# Altium footprint library IC_SMD_BGA.PCBLIB: 101 footprints (part 12 of 13) (continued)
## BGA100_2892_S55 [mm] "BGA, 2892-Leads, Body 55x55mmx4.30mm, Pitch 1.00mm" (continued)
BB35(7.5,-14.5) BB36(8.5,-14.5) BB37(9.5,-14.5) BB38(10.5,-14.5) BB39(11.5,-14.5) BB40(12.5,-14.5) BB41(13.5,-14.5) BB42(14.5,-14.5) BB43(15.5,-14.5) BB44(16.5,-14.5) BB45(17.5,-14.5) BB46(18.5,-14.5) BB47(19.5,-14.5) BB48(20.5,-14.5) BB49(21.5,-14.5) BB50(22.5,-14.5) BB51(23.5,-14.5) BB52(24.5,-14.5) BB53(25.5,-14.5) BB54(26.5,-14.5) BC1(-26.5,-15.5) BC2(-25.5,-15.5) BC3(-24.5,-15.5) BC4(-23.5,-15.5) BC5(-22.5,-15.5) BC6(-21.5,-15.5) BC7(-20.5,-15.5) BC8(-19.5,-15.5) BC9(-18.5,-15.5) BC10(-17.5,-15.5) BC11(-16.5,-15.5) BC12(-15.5,-15.5) BC13(-14.5,-15.5) BC14(-13.5,-15.5) BC15(-12.5,-15.5) BC16(-11.5,-15.5) BC17(-10.5,-15.5) BC18(-9.5,-15.5) BC19(-8.5,-15.5) BC20(-7.5,-15.5) BC21(-6.5,-15.5) BC22(-5.5,-15.5) BC23(-4.5,-15.5) BC24(-3.5,-15.5) BC25(-2.5,-15.5) BC26(-1.5,-15.5) BC27(-0.5,-15.5) BC28(0.5,-15.5) BC29(1.5,-15.5) BC30(2.5,-15.5) BC31(3.5,-15.5) BC32(4.5,-15.5) BC33(5.5,-15.5) BC34(6.5,-15.5) BC35(7.5,-15.5) BC36(8.5,-15.5) BC37(9.5,-15.5) BC38(10.5,-15.5) BC39(11.5,-15.5) BC40(12.5,-15.5) BC41(13.5,-15.5) BC42(14.5,-15.5) BC43(15.5,-15.5) BC44(16.5,-15.5) BC45(17.5,-15.5) BC46(18.5,-15.5) BC47(19.5,-15.5) BC48(20.5,-15.5) BC49(21.5,-15.5) BC50(22.5,-15.5) BC51(23.5,-15.5) BC52(24.5,-15.5) BC53(25.5,-15.5) BC54(26.5,-15.5) BD1(-26.5,-16.5) BD2(-25.5,-16.5) BD3(-24.5,-16.5) BD4(-23.5,-16.5) BD5(-22.5,-16.5) BD6(-21.5,-16.5) BD7(-20.5,-16.5) BD8(-19.5,-16.5) BD9(-18.5,-16.5) BD10(-17.5,-16.5) BD11(-16.5,-16.5) BD12(-15.5,-16.5) BD13(-14.5,-16.5) BD14(-13.5,-16.5) BD15(-12.5,-16.5) BD16(-11.5,-16.5) BD17(-10.5,-16.5) BD18(-9.5,-16.5) BD19(-8.5,-16.5) BD20(-7.5,-16.5) BD21(-6.5,-16.5) BD22(-5.5,-16.5) BD23(-4.5,-16.5) BD24(-3.5,-16.5) BD25(-2.5,-16.5) BD26(-1.5,-16.5) BD27(-0.5,-16.5) BD28(0.5,-16.5) BD29(1.5,-16.5) BD30(2.5,-16.5) BD31(3.5,-16.5) BD32(4.5,-16.5) BD33(5.5,-16.5) BD34(6.5,-16.5) BD35(7.5,-16.5) BD36(8.5,-16.5) BD37(9.5,-16.5) BD38(10.5,-16.5) BD39(11.5,-16.5) BD40(12.5,-16.5) BD41(13.5,-16.5) BD42(14.5,-16.5) BD43(15.5,-16.5) BD44(16.5,-16.5) BD45(17.5,-16.5) BD46(18.5,-16.5) BD47(19.5,-16.5) BD48(20.5,-16.5) BD49(21.5,-16.5) BD50(22.5,-16.5) BD51(23.5,-16.5) BD52(24.5,-16.5) BD53(25.5,-16.5) BD54(26.5,-16.5) BE1(-26.5,-17.5) BE2(-25.5,-17.5) BE3(-24.5,-17.5) BE4(-23.5,-17.5) BE5(-22.5,-17.5) BE6(-21.5,-17.5) BE7(-20.5,-17.5) BE8(-19.5,-17.5) BE9(-18.5,-17.5) BE10(-17.5,-17.5) BE11(-16.5,-17.5) BE12(-15.5,-17.5) BE13(-14.5,-17.5) BE14(-13.5,-17.5) BE15(-12.5,-17.5) BE16(-11.5,-17.5) BE17(-10.5,-17.5) BE18(-9.5,-17.5) BE19(-8.5,-17.5) BE20(-7.5,-17.5) BE21(-6.5,-17.5) BE22(-5.5,-17.5) BE23(-4.5,-17.5) BE24(-3.5,-17.5) BE25(-2.5,-17.5) BE26(-1.5,-17.5) BE27(-0.5,-17.5) BE28(0.5,-17.5) BE29(1.5,-17.5) BE30(2.5,-17.5) BE31(3.5,-17.5) BE32(4.5,-17.5) BE33(5.5,-17.5) BE34(6.5,-17.5) BE35(7.5,-17.5) BE36(8.5,-17.5) BE37(9.5,-17.5) BE38(10.5,-17.5) BE39(11.5,-17.5) BE40(12.5,-17.5) BE41(13.5,-17.5) BE42(14.5,-17.5) BE43(15.5,-17.5) BE44(16.5,-17.5) BE45(17.5,-17.5) BE46(18.5,-17.5) BE47(19.5,-17.5) BE48(20.5,-17.5) BE49(21.5,-17.5) BE50(22.5,-17.5) BE51(23.5,-17.5) BE52(24.5,-17.5) BE53(25.5,-17.5) BE54(26.5,-17.5) BF1(-26.5,-18.5) BF2(-25.5,-18.5) BF3(-24.5,-18.5) BF4(-23.5,-18.5) BF5(-22.5,-18.5) BF6(-21.5,-18.5) BF7(-20.5,-18.5) BF8(-19.5,-18.5) BF9(-18.5,-18.5) BF10(-17.5,-18.5) BF11(-16.5,-18.5) BF12(-15.5,-18.5) BF13(-14.5,-18.5) BF14(-13.5,-18.5) BF15(-12.5,-18.5) BF16(-11.5,-18.5) BF17(-10.5,-18.5) BF18(-9.5,-18.5) BF19(-8.5,-18.5) BF20(-7.5,-18.5) BF21(-6.5,-18.5) BF22(-5.5,-18.5) BF23(-4.5,-18.5) BF24(-3.5,-18.5) BF25(-2.5,-18.5) BF26(-1.5,-18.5) BF27(-0.5,-18.5) BF28(0.5,-18.5) BF29(1.5,-18.5) BF30(2.5,-18.5) BF31(3.5,-18.5) BF32(4.5,-18.5) BF33(5.5,-18.5) BF34(6.5,-18.5) BF35(7.5,-18.5) BF36(8.5,-18.5) BF37(9.5,-18.5) BF38(10.5,-18.5) BF39(11.5,-18.5) BF40(12.5,-18.5) BF41(13.5,-18.5) BF42(14.5,-18.5) BF43(15.5,-18.5) BF44(16.5,-18.5) BF45(17.5,-18.5) BF46(18.5,-18.5) BF47(19.5,-18.5) BF48(20.5,-18.5) BF49(21.5,-18.5) BF50(22.5,-18.5) BF51(23.5,-18.5) BF52(24.5,-18.5) BF53(25.5,-18.5) BF54(26.5,-18.5) BG1(-26.5,-19.5) BG2(-25.5,-19.5) BG3(-24.5,-19.5) BG4(-23.5,-19.5) BG5(-22.5,-19.5) BG6(-21.5,-19.5) BG7(-20.5,-19.5) BG8(-19.5,-19.5) BG9(-18.5,-19.5) BG10(-17.5,-19.5) BG11(-16.5,-19.5) BG12(-15.5,-19.5) BG13(-14.5,-19.5) BG14(-13.5,-19.5) BG15(-12.5,-19.5) BG16(-11.5,-19.5) BG17(-10.5,-19.5) BG18(-9.5,-19.5) BG19(-8.5,-19.5) BG20(-7.5,-19.5) BG21(-6.5,-19.5) BG22(-5.5,-19.5) BG23(-4.5,-19.5) BG24(-3.5,-19.5) BG25(-2.5,-19.5) BG26(-1.5,-19.5) BG27(-0.5,-19.5) BG28(0.5,-19.5) BG29(1.5,-19.5) BG30(2.5,-19.5) BG31(3.5,-19.5) BG32(4.5,-19.5) BG33(5.5,-19.5) BG34(6.5,-19.5) BG35(7.5,-19.5) BG36(8.5,-19.5) BG37(9.5,-19.5) BG38(10.5,-19.5) BG39(11.5,-19.5) BG40(12.5,-19.5) BG41(13.5,-19.5) BG42(14.5,-19.5) BG43(15.5,-19.5) BG44(16.5,-19.5) BG45(17.5,-19.5) BG46(18.5,-19.5) BG47(19.5,-19.5) BG48(20.5,-19.5) BG49(21.5,-19.5) BG50(22.5,-19.5) BG51(23.5,-19.5) BG52(24.5,-19.5) BG53(25.5,-19.5) BG54(26.5,-19.5) BH1(-26.5,-20.5) BH2(-25.5,-20.5) BH3(-24.5,-20.5) BH4(-23.5,-20.5) BH5(-22.5,-20.5) BH6(-21.5,-20.5) BH7(-20.5,-20.5) BH8(-19.5,-20.5) BH9(-18.5,-20.5) BH10(-17.5,-20.5) BH11(-16.5,-20.5) BH12(-15.5,-20.5) BH13(-14.5,-20.5) BH14(-13.5,-20.5) BH15(-12.5,-20.5) BH16(-11.5,-20.5) BH17(-10.5,-20.5) BH18(-9.5,-20.5) BH19(-8.5,-20.5) BH20(-7.5,-20.5) BH21(-6.5,-20.5) BH22(-5.5,-20.5) BH23(-4.5,-20.5) BH24(-3.5,-20.5) BH25(-2.5,-20.5) BH26(-1.5,-20.5) BH27(-0.5,-20.5) BH28(0.5,-20.5) BH29(1.5,-20.5) BH30(2.5,-20.5) BH31(3.5,-20.5) BH32(4.5,-20.5) BH33(5.5,-20.5) BH34(6.5,-20.5) BH35(7.5,-20.5) BH36(8.5,-20.5) BH37(9.5,-20.5) BH38(10.5,-20.5) BH39(11.5,-20.5) BH40(12.5,-20.5) BH41(13.5,-20.5) BH42(14.5,-20.5) BH43(15.5,-20.5) BH44(16.5,-20.5) BH45(17.5,-20.5) BH46(18.5,-20.5) BH47(19.5,-20.5) BH48(20.5,-20.5) BH49(21.5,-20.5) BH50(22.5,-20.5) BH51(23.5,-20.5) BH52(24.5,-20.5) BH53(25.5,-20.5) BH54(26.5,-20.5) BJ1(-26.5,-21.5) BJ2(-25.5,-21.5) BJ3(-24.5,-21.5) BJ4(-23.5,-21.5) BJ5(-22.5,-21.5) BJ6(-21.5,-21.5) BJ7(-20.5,-21.5) BJ8(-19.5,-21.5) BJ9(-18.5,-21.5) BJ10(-17.5,-21.5) BJ11(-16.5,-21.5) BJ12(-15.5,-21.5) BJ13(-14.5,-21.5) BJ14(-13.5,-21.5) BJ15(-12.5,-21.5) BJ16(-11.5,-21.5) BJ17(-10.5,-21.5) BJ18(-9.5,-21.5) BJ19(-8.5,-21.5) BJ20(-7.5,-21.5) BJ21(-6.5,-21.5) BJ22(-5.5,-21.5) BJ23(-4.5,-21.5) BJ24(-3.5,-21.5) BJ25(-2.5,-21.5) BJ26(-1.5,-21.5) BJ27(-0.5,-21.5) BJ28(0.5,-21.5) BJ29(1.5,-21.5) BJ30(2.5,-21.5) BJ31(3.5,-21.5) BJ32(4.5,-21.5) BJ33(5.5,-21.5) BJ34(6.5,-21.5) BJ35(7.5,-21.5) BJ36(8.5,-21.5) BJ37(9.5,-21.5) BJ38(10.5,-21.5) BJ39(11.5,-21.5) BJ40(12.5,-21.5) BJ41(13.5,-21.5) BJ42(14.5,-21.5) BJ43(15.5,-21.5) BJ44(16.5,-21.5) BJ45(17.5,-21.5) BJ46(18.5,-21.5) BJ47(19.5,-21.5) BJ48(20.5,-21.5) BJ49(21.5,-21.5) BJ50(22.5,-21.5) BJ51(23.5,-21.5) BJ52(24.5,-21.5) BJ53(25.5,-21.5) BJ54(26.5,-21.5) BK1(-26.5,-22.5) BK2(-25.5,-22.5) BK3(-24.5,-22.5) BK4(-23.5,-22.5) BK5(-22.5,-22.5) BK6(-21.5,-22.5) BK7(-20.5,-22.5) BK8(-19.5,-22.5) BK9(-18.5,-22.5) BK10(-17.5,-22.5) BK11(-16.5,-22.5) BK12(-15.5,-22.5) BK13(-14.5,-22.5) BK14(-13.5,-22.5) BK15(-12.5,-22.5) BK16(-11.5,-22.5) BK17(-10.5,-22.5) BK18(-9.5,-22.5) BK19(-8.5,-22.5) BK20(-7.5,-22.5) BK21(-6.5,-22.5) BK22(-5.5,-22.5) BK23(-4.5,-22.5) BK24(-3.5,-22.5) BK25(-2.5,-22.5) BK26(-1.5,-22.5) BK27(-0.5,-22.5) BK28(0.5,-22.5) BK29(1.5,-22.5) BK30(2.5,-22.5) BK31(3.5,-22.5) BK32(4.5,-22.5) BK33(5.5,-22.5) BK34(6.5,-22.5) BK35(7.5,-22.5) BK36(8.5,-22.5) BK37(9.5,-22.5) BK38(10.5,-22.5) BK39(11.5,-22.5) BK40(12.5,-22.5) BK41(13.5,-22.5) BK42(14.5,-22.5) BK43(15.5,-22.5) BK44(16.5,-22.5) BK45(17.5,-22.5) BK46(18.5,-22.5) BK47(19.5,-22.5) BK48(20.5,-22.5) BK49(21.5,-22.5) BK50(22.5,-22.5) BK51(23.5,-22.5) BK52(24.5,-22.5) BK53(25.5,-22.5) BK54(26.5,-22.5) BL1(-26.5,-23.5) BL2(-25.5,-23.5) BL3(-24.5,-23.5) BL4(-23.5,-23.5) BL5(-22.5,-23.5) BL6(-21.5,-23.5) BL7(-20.5,-23.5) BL8(-19.5,-23.5) BL9(-18.5,-23.5) BL10(-17.5,-23.5) BL11(-16.5,-23.5) BL12(-15.5,-23.5) BL13(-14.5,-23.5) BL14(-13.5,-23.5) BL15(-12.5,-23.5) BL16(-11.5,-23.5) BL17(-10.5,-23.5) BL18(-9.5,-23.5) BL19(-8.5,-23.5) BL20(-7.5,-23.5) BL21(-6.5,-23.5) BL22(-5.5,-23.5) BL23(-4.5,-23.5) BL24(-3.5,-23.5) BL25(-2.5,-23.5) BL26(-1.5,-23.5) BL27(-0.5,-23.5) BL28(0.5,-23.5) BL29(1.5,-23.5) BL30(2.5,-23.5) BL31(3.5,-23.5) BL32(4.5,-23.5) BL33(5.5,-23.5) BL34(6.5,-23.5) BL35(7.5,-23.5) BL36(8.5,-23.5) BL37(9.5,-23.5) BL38(10.5,-23.5) BL39(11.5,-23.5) BL40(12.5,-23.5) BL41(13.5,-23.5) BL42(14.5,-23.5) BL43(15.5,-23.5) BL44(16.5,-23.5) BL45(17.5,-23.5) BL46(18.5,-23.5) BL47(19.5,-23.5) BL48(20.5,-23.5) BL49(21.5,-23.5) BL50(22.5,-23.5) BL51(23.5,-23.5) BL52(24.5,-23.5) BL53(25.5,-23.5) BL54(26.5,-23.5) BM2(-25.5,-24.5) BM3(-24.5,-24.5) BM4(-23.5,-24.5) BM5(-22.5,-24.5) BM6(-21.5,-24.5) BM7(-20.5,-24.5) BM8(-19.5,-24.5) BM9(-18.5,-24.5) BM10(-17.5,-24.5) BM11(-16.5,-24.5) BM12(-15.5,-24.5) BM13(-14.5,-24.5) BM14(-13.5,-24.5) BM15(-12.5,-24.5) BM16(-11.5,-24.5) BM17(-10.5,-24.5) BM18(-9.5,-24.5) BM19(-8.5,-24.5) BM20(-7.5,-24.5) BM21(-6.5,-24.5) BM22(-5.5,-24.5) BM23(-4.5,-24.5) BM24(-3.5,-24.5) BM25(-2.5,-24.5) BM26(-1.5,-24.5) BM27(-0.5,-24.5) BM28(0.5,-24.5) BM29(1.5,-24.5) BM30(2.5,-24.5) BM31(3.5,-24.5) BM32(4.5,-24.5) BM33(5.5,-24.5) BM34(6.5,-24.5) BM35(7.5,-24.5) BM36(8.5,-24.5) BM37(9.5,-24.5) BM38(10.5,-24.5) BM39(11.5,-24.5) BM40(12.5,-24.5) BM41(13.5,-24.5) BM42(14.5,-24.5) BM43(15.5,-24.5) BM44(16.5,-24.5) BM45(17.5,-24.5) BM46(18.5,-24.5) BM47(19.5,-24.5) BM48(20.5,-24.5) BM49(21.5,-24.5) BM50(22.5,-24.5) BM51(23.5,-24.5) BM52(24.5,-24.5) BM53(25.5,-24.5) BN3(-24.5,-25.5) BN4(-23.5,-25.5) BN5(-22.5,-25.5) BN6(-21.5,-25.5) BN7(-20.5,-25.5) BN8(-19.5,-25.5) BN9(-18.5,-25.5) BN10(-17.5,-25.5) BN11(-16.5,-25.5) BN12(-15.5,-25.5) BN13(-14.5,-25.5) BN14(-13.5,-25.5) BN15(-12.5,-25.5) BN16(-11.5,-25.5) BN17(-10.5,-25.5) BN18(-9.5,-25.5) BN19(-8.5,-25.5) BN20(-7.5,-25.5) BN21(-6.5,-25.5) BN22(-5.5,-25.5) BN23(-4.5,-25.5) BN24(-3.5,-25.5) BN25(-2.5,-25.5) BN26(-1.5,-25.5) BN27(-0.5,-25.5) BN28(0.5,-25.5) BN29(1.5,-25.5) BN30(2.5,-25.5) BN31(3.5,-25.5) BN32(4.5,-25.5) BN33(5.5,-25.5) BN34(6.5,-25.5) BN35(7.5,-25.5) BN36(8.5,-25.5) BN37(9.5,-25.5) BN38(10.5,-25.5) BN39(11.5,-25.5) BN40(12.5,-25.5) BN41(13.5,-25.5) BN42(14.5,-25.5) BN43(15.5,-25.5) BN44(16.5,-25.5) BN45(17.5,-25.5) BN46(18.5,-25.5) BN47(19.5,-25.5) BN48(20.5,-25.5) BN49(21.5,-25.5) BN50(22.5,-25.5) BN51(23.5,-25.5) BN52(24.5,-25.5) BP4(-23.5,-26.5) BP5(-22.5,-26.5) BP6(-21.5,-26.5) BP7(-20.5,-26.5) BP8(-19.5,-26.5) BP9(-18.5,-26.5) BP10(-17.5,-26.5) BP11(-16.5,-26.5) BP12(-15.5,-26.5) BP13(-14.5,-26.5) BP14(-13.5,-26.5) BP15(-12.5,-26.5) BP16(-11.5,-26.5) BP17(-10.5,-26.5) BP18(-9.5,-26.5) BP19(-8.5,-26.5) BP20(-7.5,-26.5) BP21(-6.5,-26.5) BP22(-5.5,-26.5) BP23(-4.5,-26.5) BP24(-3.5,-26.5) BP25(-2.5,-26.5) BP26(-1.5,-26.5) BP27(-0.5,-26.5) BP28(0.5,-26.5) BP29(1.5,-26.5) BP30(2.5,-26.5) BP31(3.5,-26.5) BP32(4.5,-26.5) BP33(5.5,-26.5) BP34(6.5,-26.5) BP35(7.5,-26.5) BP36(8.5,-26.5) BP37(9.5,-26.5) BP38(10.5,-26.5) BP39(11.5,-26.5) BP40(12.5,-26.5) BP41(13.5,-26.5) BP42(14.5,-26.5) BP43(15.5,-26.5) BP44(16.5,-26.5) BP45(17.5,-26.5) BP46(18.5,-26.5) BP47(19.5,-26.5) BP48(20.5,-26.5) BP49(21.5,-26.5) BP50(22.5,-26.5) BP51(23.5,-26.5) C2(-25.5,24.5) C3(-24.5,24.5) C4(-23.5,24.5) C5(-22.5,24.5) C6(-21.5,24.5) C7(-20.5,24.5) C8(-19.5,24.5) C9(-18.5,24.5) C10(-17.5,24.5) C11(-16.5,24.5) C12(-15.5,24.5) C13(-14.5,24.5) C14(-13.5,24.5) C15(-12.5,24.5) C16(-11.5,24.5) C17(-10.5,24.5) C18(-9.5,24.5) C19(-8.5,24.5) C20(-7.5,24.5) C21(-6.5,24.5) C22(-5.5,24.5) C23(-4.5,24.5) C24(-3.5,24.5) C25(-2.5,24.5) C26(-1.5,24.5) C27(-0.5,24.5) C28(0.5,24.5) C29(1.5,24.5) C30(2.5,24.5) C31(3.5,24.5) C32(4.5,24.5) C33(5.5,24.5) C34(6.5,24.5) C35(7.5,24.5) C36(8.5,24.5) C37(9.5,24.5) C38(10.5,24.5) C39(11.5,24.5) C40(12.5,24.5) C41(13.5,24.5) C42(14.5,24.5) C43(15.5,24.5) C44(16.5,24.5) C45(17.5,24.5) C46(18.5,24.5) C47(19.5,24.5) C48(20.5,24.5) C49(21.5,24.5) C50(22.5,24.5) C51(23.5,24.5) C52(24.5,24.5) C53(25.5,24.5) D1(-26.5,23.5) D2(-25.5,23.5) D3(-24.5,23.5) D4(-23.5,23.5) D5(-22.5,23.5) D6(-21.5,23.5) D7(-20.5,23.5) D8(-19.5,23.5) D9(-18.5,23.5) D10(-17.5,23.5) D11(-16.5,23.5) D12(-15.5,23.5) D13(-14.5,23.5) D14(-13.5,23.5) D15(-12.5,23.5) D16(-11.5,23.5) D17(-10.5,23.5) D18(-9.5,23.5) D19(-8.5,23.5) D20(-7.5,23.5) D21(-6.5,23.5) D22(-5.5,23.5) D23(-4.5,23.5) D24(-3.5,23.5) D25(-2.5,23.5) D26(-1.5,23.5) D27(-0.5,23.5) D28(0.5,23.5) D29(1.5,23.5) D30(2.5,23.5) D31(3.5,23.5) D32(4.5,23.5) D33(5.5,23.5) D34(6.5,23.5) D35(7.5,23.5) D36(8.5,23.5) D37(9.5,23.5) D38(10.5,23.5) D39(11.5,23.5) D40(12.5,23.5) D41(13.5,23.5) D42(14.5,23.5) D43(15.5,23.5) D44(16.5,23.5) D45(17.5,23.5) D46(18.5,23.5) D47(19.5,23.5) D48(20.5,23.5) D49(21.5,23.5) D50(22.5,23.5) D51(23.5,23.5) D52(24.5,23.5) D53(25.5,23.5) D54(26.5,23.5) E1(-26.5,22.5) E2(-25.5,22.5) E3(-24.5,22.5) E4(-23.5,22.5) E5(-22.5,22.5) E6(-21.5,22.5) E7(-20.5,22.5) E8(-19.5,22.5) E9(-18.5,22.5) E10(-17.5,22.5) E11(-16.5,22.5) E12(-15.5,22.5) E13(-14.5,22.5) E14(-13.5,22.5) E15(-12.5,22.5) E16(-11.5,22.5) E17(-10.5,22.5) E18(-9.5,22.5) E19(-8.5,22.5) E20(-7.5,22.5) E21(-6.5,22.5) E22(-5.5,22.5) E23(-4.5,22.5) E24(-3.5,22.5) E25(-2.5,22.5) E26(-1.5,22.5) E27(-0.5,22.5) E28(0.5,22.5) E29(1.5,22.5) E30(2.5,22.5) E31(3.5,22.5) E32(4.5,22.5) E33(5.5,22.5) E34(6.5,22.5) E35(7.5,22.5) E36(8.5,22.5) E37(9.5,22.5) E38(10.5,22.5) E39(11.5,22.5) E40(12.5,22.5) E41(13.5,22.5) E42(14.5,22.5) E43(15.5,22.5) E44(16.5,22.5) E45(17.5,22.5) E46(18.5,22.5) E47(19.5,22.5) E48(20.5,22.5) E49(21.5,22.5) E50(22.5,22.5) E51(23.5,22.5) E52(24.5,22.5) E53(25.5,22.5) E54(26.5,22.5) F1(-26.5,21.5) F2(-25.5,21.5) F3(-24.5,21.5) F4(-23.5,21.5) F5(-22.5,21.5) F6(-21.5,21.5) F7(-20.5,21.5) F8(-19.5,21.5) F9(-18.5,21.5) F10(-17.5,21.5) F11(-16.5,21.5) F12(-15.5,21.5) F13(-14.5,21.5) F14(-13.5,21.5) F15(-12.5,21.5) F16(-11.5,21.5) F17(-10.5,21.5) F18(-9.5,21.5) F19(-8.5,21.5) F20(-7.5,21.5) F21(-6.5,21.5) F22(-5.5,21.5) F23(-4.5,21.5) F24(-3.5,21.5) F25(-2.5,21.5) F26(-1.5,21.5) F27(-0.5,21.5) F28(0.5,21.5) F29(1.5,21.5) F30(2.5,21.5) F31(3.5,21.5) F32(4.5,21.5) F33(5.5,21.5) F34(6.5,21.5) F35(7.5,21.5) F36(8.5,21.5) F37(9.5,21.5) F38(10.5,21.5) F39(11.5,21.5) F40(12.5,21.5) F41(13.5,21.5) F42(14.5,21.5) F43(15.5,21.5) F44(16.5,21.5) F45(17.5,21.5) F46(18.5,21.5) F47(19.5,21.5) F48(20.5,21.5) F49(21.5,21.5) F50(22.5,21.5) F51(23.5,21.5) F52(24.5,21.5) F53(25.5,21.5) F54(26.5,21.5) G1(-26.5,20.5) G2(-25.5,20.5) G3(-24.5,20.5) G4(-23.5,20.5) G5(-22.5,20.5) G6(-21.5,20.5) G7(-20.5,20.5) G8(-19.5,20.5) G9(-18.5,20.5) G10(-17.5,20.5) G11(-16.5,20.5) G12(-15.5,20.5) G13(-14.5,20.5) G14(-13.5,20.5) G15(-12.5,20.5) G16(-11.5,20.5) G17(-10.5,20.5) G18(-9.5,20.5) G19(-8.5,20.5) G20(-7.5,20.5) G21(-6.5,20.5) G22(-5.5,20.5) G23(-4.5,20.5) G24(-3.5,20.5) G25(-2.5,20.5) G26(-1.5,20.5) G27(-0.5,20.5) G28(0.5,20.5) G29(1.5,20.5) G30(2.5,20.5) G31(3.5,20.5) G32(4.5,20.5) G33(5.5,20.5) G34(6.5,20.5) G35(7.5,20.5) G36(8.5,20.5) G37(9.5,20.5) G38(10.5,20.5) G39(11.5,20.5) G40(12.5,20.5) G41(13.5,20.5) G42(14.5,20.5) G43(15.5,20.5) G44(16.5,20.5) G45(17.5,20.5) G46(18.5,20.5) G47(19.5,20.5) G48(20.5,20.5) G49(21.5,20.5) G50(22.5,20.5) G51(23.5,20.5) G52(24.5,20.5) G53(25.5,20.5) G54(26.5,20.5) H1(-26.5,19.5) H2(-25.5,19.5) H3(-24.5,19.5) H4(-23.5,19.5) H5(-22.5,19.5) H6(-21.5,19.5) H7(-20.5,19.5) H8(-19.5,19.5) H9(-18.5,19.5) H10(-17.5,19.5) H11(-16.5,19.5) H12(-15.5,19.5) H13(-14.5,19.5) H14(-13.5,19.5) H15(-12.5,19.5) H16(-11.5,19.5) H17(-10.5,19.5) H18(-9.5,19.5) H19(-8.5,19.5) H20(-7.5,19.5) H21(-6.5,19.5) H22(-5.5,19.5) H23(-4.5,19.5) H24(-3.5,19.5) H25(-2.5,19.5) H26(-1.5,19.5) H27(-0.5,19.5) H28(0.5,19.5) H29(1.5,19.5) H30(2.5,19.5) H31(3.5,19.5) H32(4.5,19.5) H33(5.5,19.5) H34(6.5,19.5) H35(7.5,19.5) H36(8.5,19.5) H37(9.5,19.5) H38(10.5,19.5) H39(11.5,19.5) H40(12.5,19.5) H41(13.5,19.5) H42(14.5,19.5) H43(15.5,19.5) H44(16.5,19.5) H45(17.5,19.5) H46(18.5,19.5) H47(19.5,19.5) H48(20.5,19.5) H49(21.5,19.5) H50(22.5,19.5) H51(23.5,19.5) H52(24.5,19.5) H53(25.5,19.5) H54(26.5,19.5) J1(-26.5,18.5) J2(-25.5,18.5) J3(-24.5,18.5) J4(-23.5,18.5) J5(-22.5,18.5) J6(-21.5,18.5) J7(-20.5,18.5) J8(-19.5,18.5) J9(-18.5,18.5) J10(-17.5,18.5) J11(-16.5,18.5) J12(-15.5,18.5) J13(-14.5,18.5) J14(-13.5,18.5) J15(-12.5,18.5) J16(-11.5,18.5) J17(-10.5,18.5) J18(-9.5,18.5) J19(-8.5,18.5) J20(-7.5,18.5) J21(-6.5,18.5) J22(-5.5,18.5) J23(-4.5,18.5) J24(-3.5,18.5) J25(-2.5,18.5) J26(-1.5,18.5) J27(-0.5,18.5) J28(0.5,18.5) J29(1.5,18.5) J30(2.5,18.5) J31(3.5,18.5) J32(4.5,18.5) J33(5.5,18.5) J34(6.5,18.5) J35(7.5,18.5) J36(8.5,18.5) J37(9.5,18.5) J38(10.5,18.5) J39(11.5,18.5) J40(12.5,18.5) J41(13.5,18.5) J42(14.5,18.5) J43(15.5,18.5) J44(16.5,18.5) J45(17.5,18.5) J46(18.5,18.5) J47(19.5,18.5) J48(20.5,18.5) J49(21.5,18.5) J50(22.5,18.5) J51(23.5,18.5) J52(24.5,18.5) J53(25.5,18.5) J54(26.5,18.5) K1(-26.5,17.5) K2(-25.5,17.5) K3(-24.5,17.5) K4(-23.5,17.5) K5(-22.5,17.5) K6(-21.5,17.5) K7(-20.5,17.5) K8(-19.5,17.5) K9(-18.5,17.5) K10(-17.5,17.5) K11(-16.5,17.5) K12(-15.5,17.5) K13(-14.5,17.5) K14(-13.5,17.5) K15(-12.5,17.5) K16(-11.5,17.5) K17(-10.5,17.5) K18(-9.5,17.5) K19(-8.5,17.5) K20(-7.5,17.5) K21(-6.5,17.5) K22(-5.5,17.5) K23(-4.5,17.5) K24(-3.5,17.5) K25(-2.5,17.5) K26(-1.5,17.5) K27(-0.5,17.5) K28(0.5,17.5) K29(1.5,17.5) K30(2.5,17.5) K31(3.5,17.5) K32(4.5,17.5) K33(5.5,17.5) K34(6.5,17.5) K35(7.5,17.5) K36(8.5,17.5) K37(9.5,17.5) K38(10.5,17.5) K39(11.5,17.5) K40(12.5,17.5) K41(13.5,17.5) K42(14.5,17.5) K43(15.5,17.5) K44(16.5,17.5) K45(17.5,17.5) K46(18.5,17.5) K47(19.5,17.5) K48(20.5,17.5) K49(21.5,17.5) K50(22.5,17.5) K51(23.5,17.5) K52(24.5,17.5) K53(25.5,17.5) K54(26.5,17.5) L1(-26.5,16.5) L2(-25.5,16.5) L3(-24.5,16.5) L4(-23.5,16.5) L5(-22.5,16.5) L6(-21.5,16.5) L7(-20.5,16.5) L8(-19.5,16.5) L9(-18.5,16.5) L10(-17.5,16.5) L11(-16.5,16.5) L12(-15.5,16.5) L13(-14.5,16.5) L14(-13.5,16.5) L15(-12.5,16.5) L16(-11.5,16.5) L17(-10.5,16.5) L18(-9.5,16.5) L19(-8.5,16.5) L20(-7.5,16.5) L21(-6.5,16.5) L22(-5.5,16.5) L23(-4.5,16.5) L24(-3.5,16.5) L25(-2.5,16.5) L26(-1.5,16.5) L27(-0.5,16.5) L28(0.5,16.5) L29(1.5,16.5) L30(2.5,16.5) L31(3.5,16.5) L32(4.5,16.5) L33(5.5,16.5) L34(6.5,16.5) L35(7.5,16.5) L36(8.5,16.5) L37(9.5,16.5) L38(10.5,16.5) L39(11.5,16.5) L40(12.5,16.5) L41(13.5,16.5) L42(14.5,16.5) L43(15.5,16.5) L44(16.5,16.5) L45(17.5,16.5) L46(18.5,16.5) L47(19.5,16.5) L48(20.5,16.5) L49(21.5,16.5) L50(22.5,16.5) L51(23.5,16.5) L52(24.5,16.5) L53(25.5,16.5) L54(26.5,16.5) M1(-26.5,15.5) M2(-25.5,15.5) M3(-24.5,15.5) M4(-23.5,15.5) M5(-22.5,15.5) M6(-21.5,15.5) M7(-20.5,15.5) M8(-19.5,15.5) M9(-18.5,15.5) M10(-17.5,15.5) M11(-16.5,15.5) M12(-15.5,15.5) M13(-14.5,15.5) M14(-13.5,15.5) M15(-12.5,15.5) M16(-11.5,15.5) M17(-10.5,15.5) M18(-9.5,15.5) M19(-8.5,15.5) M20(-7.5,15.5) M21(-6.5,15.5) M22(-5.5,15.5) M23(-4.5,15.5) M24(-3.5,15.5) M25(-2.5,15.5) M26(-1.5,15.5) M27(-0.5,15.5) M28(0.5,15.5) M29(1.5,15.5) M30(2.5,15.5) M31(3.5,15.5) M32(4.5,15.5) M33(5.5,15.5) M34(6.5,15.5) M35(7.5,15.5) M36(8.5,15.5) M37(9.5,15.5) M38(10.5,15.5) M39(11.5,15.5) M40(12.5,15.5) M41(13.5,15.5) M42(14.5,15.5) M43(15.5,15.5) M44(16.5,15.5) M45(17.5,15.5) M46(18.5,15.5) M47(19.5,15.5) M48(20.5,15.5) M49(21.5,15.5) M50(22.5,15.5) M51(23.5,15.5) M52(24.5,15.5) M53(25.5,15.5) M54(26.5,15.5) N1(-26.5,14.5) N2(-25.5,14.5) N3(-24.5,14.5) N4(-23.5,14.5) N5(-22.5,14.5) N6(-21.5,14.5) N7(-20.5,14.5) N8(-19.5,14.5) N9(-18.5,14.5) N10(-17.5,14.5) N11(-16.5,14.5) N12(-15.5,14.5) N13(-14.5,14.5) N14(-13.5,14.5) N15(-12.5,14.5) N16(-11.5,14.5) N17(-10.5,14.5) N18(-9.5,14.5) N19(-8.5,14.5) N20(-7.5,14.5) N21(-6.5,14.5) N22(-5.5,14.5) N23(-4.5,14.5) N24(-3.5,14.5) N25(-2.5,14.5) N26(-1.5,14.5) N27(-0.5,14.5) N28(0.5,14.5) N29(1.5,14.5) N30(2.5,14.5) N31(3.5,14.5) N32(4.5,14.5) N33(5.5,14.5) N34(6.5,14.5) N35(7.5,14.5) N36(8.5,14.5) N37(9.5,14.5) N38(10.5,14.5) N39(11.5,14.5) N40(12.5,14.5) N41(13.5,14.5) N42(14.5,14.5) N43(15.5,14.5) N44(16.5,14.5) N45(17.5,14.5) N46(18.5,14.5) N47(19.5,14.5) N48(20.5,14.5) N49(21.5,14.5) N50(22.5,14.5) N51(23.5,14.5) N52(24.5,14.5) N53(25.5,14.5) N54(26.5,14.5) P1(-26.5,13.5) P2(-25.5,13.5) P3(-24.5,13.5) P4(-23.5,13.5) P5(-22.5,13.5) P6(-21.5,13.5) P7(-20.5,13.5) P8(-19.5,13.5) P9(-18.5,13.5) P10(-17.5,13.5) P11(-16.5,13.5) P12(-15.5,13.5) P13(-14.5,13.5) P14(-13.5,13.5) P15(-12.5,13.5) P16(-11.5,13.5) P17(-10.5,13.5) P18(-9.5,13.5) P19(-8.5,13.5) P20(-7.5,13.5) P21(-6.5,13.5) P22(-5.5,13.5) P23(-4.5,13.5) P24(-3.5,13.5) P25(-2.5,13.5) P26(-1.5,13.5) P27(-0.5,13.5) P28(0.5,13.5) P29(1.5,13.5) P30(2.5,13.5) P31(3.5,13.5) P32(4.5,13.5) P33(5.5,13.5) P34(6.5,13.5) P35(7.5,13.5) P36(8.5,13.5) P37(9.5,13.5) P38(10.5,13.5) P39(11.5,13.5) P40(12.5,13.5) P41(13.5,13.5) P42(14.5,13.5) P43(15.5,13.5) P44(16.5,13.5) P45(17.5,13.5) P46(18.5,13.5) P47(19.5,13.5) P48(20.5,13.5) P49(21.5,13.5) P50(22.5,13.5) P51(23.5,13.5) P52(24.5,13.5) P53(25.5,13.5) P54(26.5,13.5) R1(-26.5,12.5) R2(-25.5,12.5) R3(-24.5,12.5) R4(-23.5,12.5) R5(-22.5,12.5) R6(-21.5,12.5) R7(-20.5,12.5) R8(-19.5,12.5) R9(-18.5,12.5) R10(-17.5,12.5) R11(-16.5,12.5) R12(-15.5,12.5) R13(-14.5,12.5) R14(-13.5,12.5) R15(-12.5,12.5) R16(-11.5,12.5) R17(-10.5,12.5) R18(-9.5,12.5) R19(-8.5,12.5) R20(-7.5,12.5) R21(-6.5,12.5) R22(-5.5,12.5) R23(-4.5,12.5) R24(-3.5,12.5) R25(-2.5,12.5) R26(-1.5,12.5) R27(-0.5,12.5) R28(0.5,12.5) R29(1.5,12.5) R30(2.5,12.5) R31(3.5,12.5) R32(4.5,12.5) R33(5.5,12.5) R34(6.5,12.5) R35(7.5,12.5) R36(8.5,12.5) R37(9.5,12.5) R38(10.5,12.5) R39(11.5,12.5) R40(12.5,12.5) R41(13.5,12.5) R42(14.5,12.5) R43(15.5,12.5) R44(16.5,12.5) R45(17.5,12.5) R46(18.5,12.5) R47(19.5,12.5) R48(20.5,12.5) R49(21.5,12.5) R50(22.5,12.5) R51(23.5,12.5) R52(24.5,12.5) R53(25.5,12.5) R54(26.5,12.5) T1(-26.5,11.5) T2(-25.5,11.5) T3(-24.5,11.5) T4(-23.5,11.5) T5(-22.5,11.5) T6(-21.5,11.5) T7(-20.5,11.5) T8(-19.5,11.5) T9(-18.5,11.5) T10(-17.5,11.5) T11(-16.5,11.5) T12(-15.5,11.5) T13(-14.5,11.5) T14(-13.5,11.5) T15(-12.5,11.5) T16(-11.5,11.5) T17(-10.5,11.5) T18(-9.5,11.5) T19(-8.5,11.5) T20(-7.5,11.5) T21(-6.5,11.5) T22(-5.5,11.5) T23(-4.5,11.5) T24(-3.5,11.5) T25(-2.5,11.5) T26(-1.5,11.5) T27(-0.5,11.5) T28(0.5,11.5) T29(1.5,11.5) T30(2.5,11.5) T31(3.5,11.5) T32(4.5,11.5) T33(5.5,11.5) T34(6.5,11.5) T35(7.5,11.5) T36(8.5,11.5) T37(9.5,11.5) T38(10.5,11.5) T39(11.5,11.5) T40(12.5,11.5) T41(13.5,11.5) T42(14.5,11.5) T43(15.5,11.5) T44(16.5,11.5) T45(17.5,11.5) T46(18.5,11.5) T47(19.5,11.5) T48(20.5,11.5) T49(21.5,11.5) T50(22.5,11.5) T51(23.5,11.5) T52(24.5,11.5) T53(25.5,11.5) T54(26.5,11.5) U1(-26.5,10.5) U2(-25.5,10.5) U3(-24.5,10.5) U4(-23.5,10.5) U5(-22.5,10.5) U6(-21.5,10.5) U7(-20.5,10.5) U8(-19.5,10.5) U9(-18.5,10.5) U10(-17.5,10.5) U11(-16.5,10.5) U12(-15.5,10.5) U13(-14.5,10.5) U14(-13.5,10.5) U15(-12.5,10.5) U16(-11.5,10.5) U17(-10.5,10.5) U18(-9.5,10.5) U19(-8.5,10.5) U20(-7.5,10.5) U21(-6.5,10.5) U22(-5.5,10.5) U23(-4.5,10.5) U24(-3.5,10.5) U25(-2.5,10.5) U26(-1.5,10.5) U27(-0.5,10.5) U28(0.5,10.5) U29(1.5,10.5) U30(2.5,10.5) U31(3.5,10.5) U32(4.5,10.5) U33(5.5,10.5) U34(6.5,10.5) U35(7.5,10.5) U36(8.5,10.5) U37(9.5,10.5) U38(10.5,10.5) U39(11.5,10.5) U40(12.5,10.5) U41(13.5,10.5) U42(14.5,10.5) U43(15.5,10.5) U44(16.5,10.5) U45(17.5,10.5) U46(18.5,10.5) U47(19.5,10.5) U48(20.5,10.5) U49(21.5,10.5) U50(22.5,10.5) U51(23.5,10.5) U52(24.5,10.5) U53(25.5,10.5) U54(26.5,10.5) V1(-26.5,9.5) V2(-25.5,9.5) V3(-24.5,9.5) V4(-23.5,9.5) V5(-22.5,9.5) V6(-21.5,9.5) V7(-20.5,9.5) V8(-19.5,9.5) V9(-18.5,9.5) V10(-17.5,9.5) V11(-16.5,9.5) V12(-15.5,9.5) V13(-14.5,9.5) V14(-13.5,9.5) V15(-12.5,9.5) V16(-11.5,9.5) V17(-10.5,9.5) V18(-9.5,9.5) V19(-8.5,9.5) V20(-7.5,9.5) V21(-6.5,9.5) V22(-5.5,9.5) V23(-4.5,9.5) V24(-3.5,9.5) V25(-2.5,9.5) V26(-1.5,9.5) V27(-0.5,9.5) V28(0.5,9.5) V29(1.5,9.5) V30(2.5,9.5) V31(3.5,9.5) V32(4.5,9.5) V33(5.5,9.5) V34(6.5,9.5) V35(7.5,9.5) V36(8.5,9.5) V37(9.5,9.5) V38(10.5,9.5) V39(11.5,9.5) V40(12.5,9.5) V41(13.5,9.5) V42(14.5,9.5) V43(15.5,9.5) V44(16.5,9.5) V45(17.5,9.5) V46(18.5,9.5) V47(19.5,9.5) V48(20.5,9.5) V49(21.5,9.5) V50(22.5,9.5) V51(23.5,9.5) V52(24.5,9.5) V53(25.5,9.5) V54(26.5,9.5) W1(-26.5,8.5) W2(-25.5,8.5) W3(-24.5,8.5) W4(-23.5,8.5) W5(-22.5,8.5) W6(-21.5,8.5) W7(-20.5,8.5) W8(-19.5,8.5) W9(-18.5,8.5) W10(-17.5,8.5) W11(-16.5,8.5) W12(-15.5,8.5) W13(-14.5,8.5) W14(-13.5,8.5) W15(-12.5,8.5) W16(-11.5,8.5) W17(-10.5,8.5) W18(-9.5,8.5) W19(-8.5,8.5) W20(-7.5,8.5) W21(-6.5,8.5) W22(-5.5,8.5) W23(-4.5,8.5) W24(-3.5,8.5) W25(-2.5,8.5) W26(-1.5,8.5) W27(-0.5,8.5) W28(0.5,8.5) W29(1.5,8.5) W30(2.5,8.5) W31(3.5,8.5) W32(4.5,8.5) W33(5.5,8.5) W34(6.5,8.5) W35(7.5,8.5) W36(8.5,8.5) W37(9.5,8.5) W38(10.5,8.5) W39(11.5,8.5) W40(12.5,8.5) W41(13.5,8.5) W42(14.5,8.5) W43(15.5,8.5) W44(16.5,8.5) W45(17.5,8.5) W46(18.5,8.5) W47(19.5,8.5) W48(20.5,8.5) W49(21.5,8.5) W50(22.5,8.5) W51(23.5,8.5) W52(24.5,8.5) W53(25.5,8.5) W54(26.5,8.5) Y1(-26.5,7.5) Y2(-25.5,7.5) Y3(-24.5,7.5) Y4(-23.5,7.5) Y5(-22.5,7.5) Y6(-21.5,7.5) Y7(-20.5,7.5) Y8(-19.5,7.5) Y9(-18.5,7.5) Y10(-17.5,7.5) Y11(-16.5,7.5) Y12(-15.5,7.5) Y13(-14.5,7.5) Y14(-13.5,7.5) Y15(-12.5,7.5) Y16(-11.5,7.5) Y17(-10.5,7.5) Y18(-9.5,7.5) Y19(-8.5,7.5) Y20(-7.5,7.5) Y21(-6.5,7.5) Y22(-5.5,7.5) Y23(-4.5,7.5) Y24(-3.5,7.5) Y25(-2.5,7.5) Y26(-1.5,7.5) Y27(-0.5,7.5) Y28(0.5,7.5) Y29(1.5,7.5) Y30(2.5,7.5) Y31(3.5,7.5) Y32(4.5,7.5) Y33(5.5,7.5) Y34(6.5,7.5) Y35(7.5,7.5) Y36(8.5,7.5) Y37(9.5,7.5) Y38(10.5,7.5) Y39(11.5,7.5) Y40(12.5,7.5) Y41(13.5,7.5) Y42(14.5,7.5) Y43(15.5,7.5) Y44(16.5,7.5) Y45(17.5,7.5) Y46(18.5,7.5) Y47(19.5,7.5) Y48(20.5,7.5) Y49(21.5,7.5) Y50(22.5,7.5) Y51(23.5,7.5) Y52(24.5,7.5) Y53(25.5,7.5) Y54(26.5,7.5)
TopOverlay:
  circle w0.2: c-27.5,27.5 r0.1
  lines w0.2: -27.5,-27.5 27.5,-27.5 27.5,27.5 -26.5,27.5 -27.5,26.5 -27.5,-27.5
Mechanical15:
  lines w0.1: -27.5,13.75 -13.75,27.5 ; -27.5,-27.5 27.5,-27.5 27.5,27.5 -27.5,27.5 -27.5,-27.5
3D body "XCVU37P-L2FSVH2892E.stp": height 4.51, standoff 0, extent -27.5,-27.5 27.5,27.5

## BGA127_40_6X11 [mm] "BGA, 5X8, 1.27mm, 6.25x11.25x5.12mm"
height 4.9
pads (40):
  round 0.6 smd mask+0.1: A1(-2.54,4.445) A2(-1.27,4.445) A3(0,4.445) A4(1.27,4.445) A5(2.54,4.445) B1(-2.54,3.175) B2(-1.27,3.175) B3(0,3.175) B4(1.27,3.175) B5(2.54,3.175) C1(-2.54,1.905) C2(-1.27,1.905) C3(0,1.905) C4(1.27,1.905) C5(2.54,1.905) D1(-2.54,0.635) D2(-1.27,0.635) D3(0,0.635) D4(1.27,0.635) D5(2.54,0.635) E1(-2.54,-0.635) E2(-1.27,-0.635) E3(0,-0.635) E4(1.27,-0.635) E5(2.54,-0.635) F1(-2.54,-1.905) F2(-1.27,-1.905) F3(0,-1.905) F4(1.27,-1.905) F5(2.54,-1.905) G1(-2.54,-3.175) G2(-1.27,-3.175) G3(0,-3.175) G4(1.27,-3.175) G5(2.54,-3.175) H1(-2.54,-4.445) H2(-1.27,-4.445) H3(0,-4.445) H4(1.27,-4.445) H5(2.54,-4.445)
TopOverlay:
  circle w0.2: c-3.8,5.4 r0.2
  lines w0.2: -3.2,-5.6 3.2,-5.6 3.2,5.7 -3.2,5.7 -3.2,-5.6
Mechanical13:
  lines w0.1: -3.125,2.812 -0.313,5.624 ; -3.125,-5.625 3.125,-5.625 3.125,5.625 -3.125,5.625 -3.125,-5.625
Mechanical15:
  lines w0.05: -5.125,-7.625 5.125,-7.625 5.125,7.625 -5.125,7.625 -5.125,-7.625
3D body "LTM8045IY#PBF.stp": height 5.12, standoff 0, extent -3.125,-5.625 3.125,5.625